# Altium footprint library PcbLib.PcbLib: 428 footprints (part 17 of 27)
Each footprint in its own frame and in the unit in brackets; x right, y up, seen from the top. Pads: shape width x height; smd on the part's side, far side on the other; paste and mask are expansions set on the pad; w line width, h text height; cw(c..) or ccw(c..) is an arc to the next point about the centre after c.
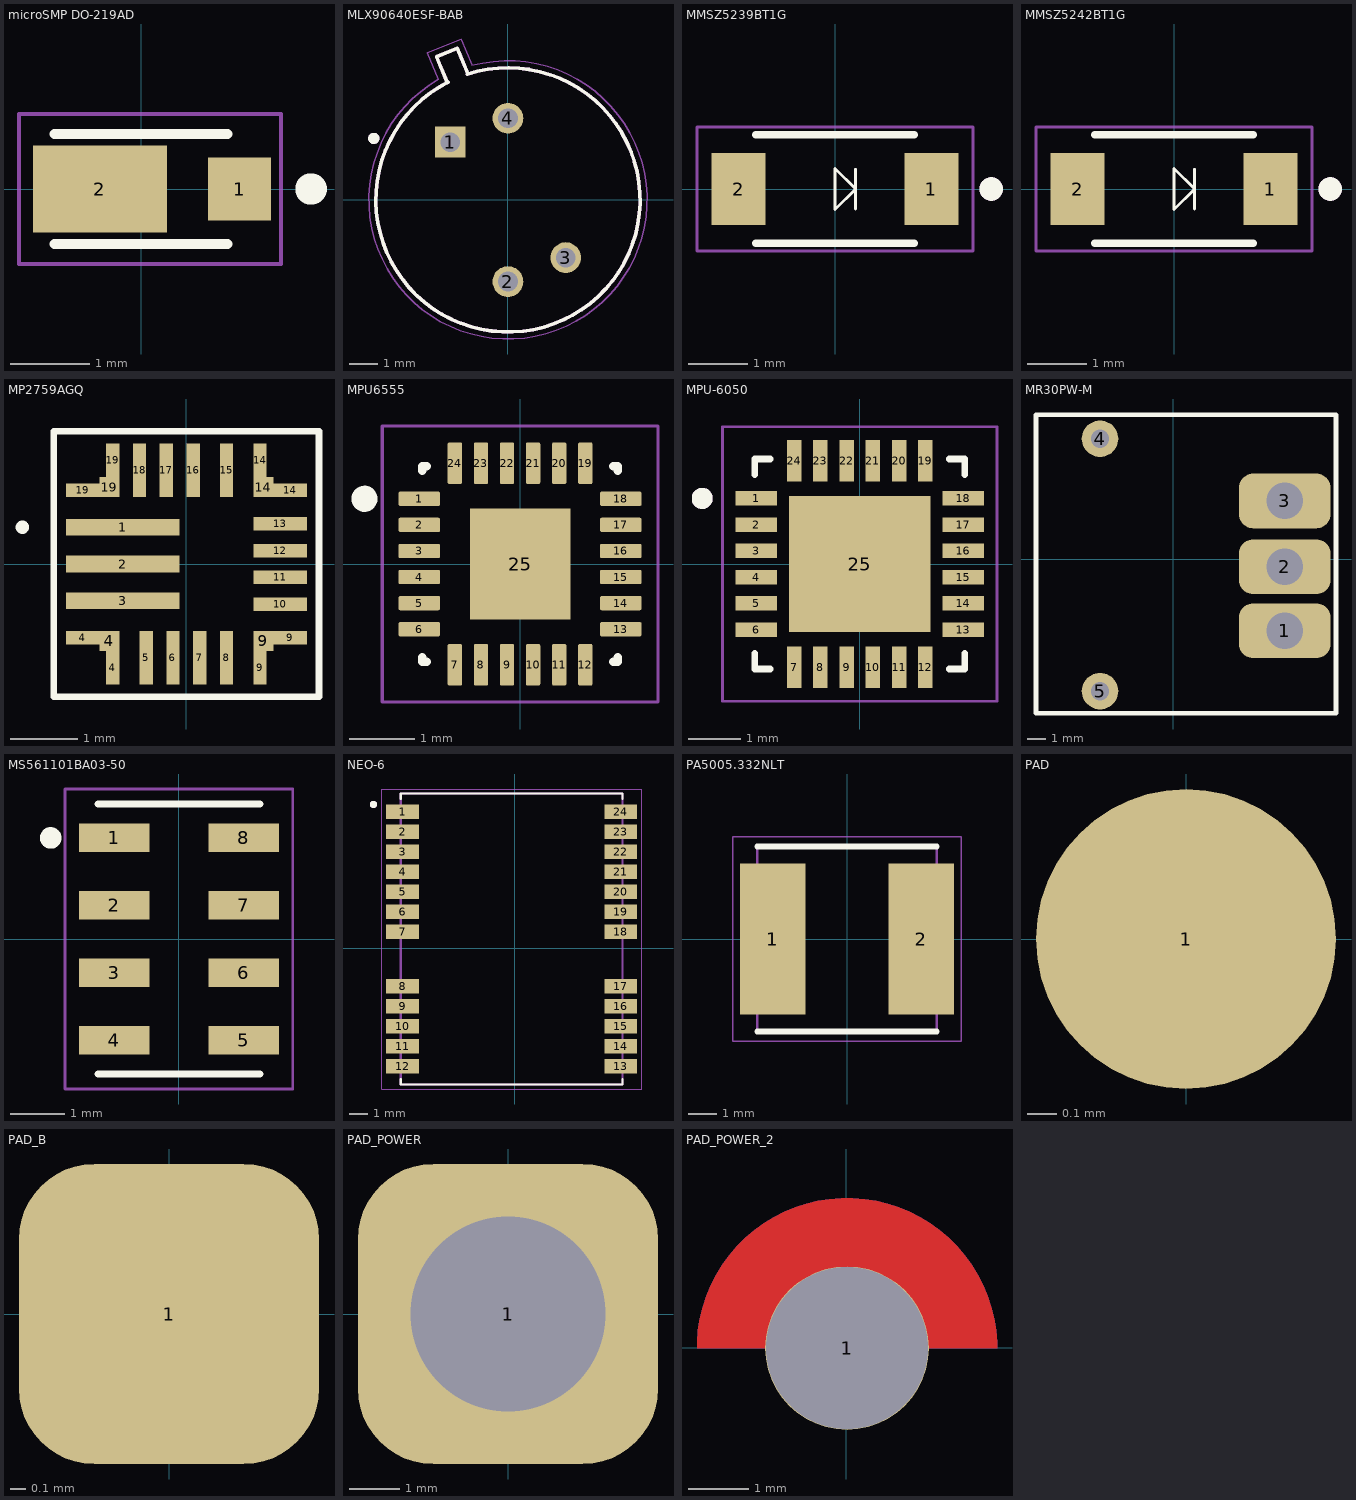
[diagram p16: the footprints below, top view; thin cyan lines are the x and y axes]

## microSMP DO-219AD [mm]
pads (2):
  rect 0.8x0.8 smd: 1(1.25,0)
  rect 1.7x1.1 smd: 2(-0.523,0)
Top Overlay:
  circle w0.2: c2.159,0 r0.1
  lines w0.127: -1.1,-0.7 1.1,-0.7 ; -1.1,0.7 1.1,0.7
Mechanical 15:
  lines w0.05: -1.549,-0.95 1.778,-0.95 1.778,0.95 -1.549,0.95 -1.549,-0.95
3D body "User Library-diode_microSMP.STEP": height 0.75, standoff 0, extent -0.971,-0.625 1.529,0.675

## MLX90640ESF-BAB [mm]
pads (4):
  rect 1.1x1.1 hole 0.7: 1(-2.065,2.067)
  round 1.1 hole 0.7: 2(0,-2.92) 3(2.065,-2.065) 4(0,2.92)
Top Overlay:
  circle w0.2: c-4.8,2.2 r0.1
  lines w0.127: -2.171,4.196 -2.554,5.12 -1.814,5.426 -1.432,4.503 ; -2.145,4.21 ccw(c0,0) -1.46,4.494
Mechanical 13:
  circle w0.2: c-4.8,2.2 r0.1
  lines w0.127: -2.171,4.196 -2.554,5.12 -1.814,5.426 -1.432,4.503 ; -2.145,4.21 ccw(c0,0) -1.46,4.494
Mechanical 15:
  lines w0.05: -2.488,4.308 -2.881,5.255 -1.679,5.753 -1.287,4.806 ; -2.487,4.309 ccw(c0,0) -1.287,4.806
3D body "MLX90640ESF-BAB-000-TU--3DModel-STEP-56544.STEP": height 11.55, standoff -6.5, extent -4.65,-4.65 4.65,5.151

## MMSZ5239BT1G [mm]
pads (2):
  rect 0.915x1.22 smd: 1(1.637,0) 2(-1.637,0)
Top Overlay:
  circle w0.2: c2.65,0 r0.1
  lines w0.05: 0,-0.35 0.35,0 0,0.35 ; 0,-0.338 0,0.337 ; 0.348,-0.339 0.348,0.336
  lines w0.127: -1.345,-0.924 1.345,-0.924 ; -1.345,0.924 1.345,0.924
Mechanical 13:
  circle w0.2: c2.65,0 r0.1
Mechanical 15:
  lines w0.05: -2.345,-1.05 2.345,-1.05 2.345,1.05 -2.345,1.05 -2.345,-1.05
3D body "step_temp.STEP": height 1.35, standoff 0, extent -1.84,-0.8 1.84,0.8

## MMSZ5242BT1G [mm]
pads (2):
  rect 0.915x1.22 smd: 1(1.637,0) 2(-1.637,0)
Top Overlay:
  circle w0.2: c2.65,0 r0.1
  lines w0.05: 0,-0.35 0.35,0 0,0.35 ; 0,-0.338 0,0.337 ; 0.348,-0.339 0.348,0.336
  lines w0.127: -1.345,-0.924 1.345,-0.924 ; -1.345,0.924 1.345,0.924
Mechanical 13:
  circle w0.2: c2.65,0 r0.1
Mechanical 15:
  lines w0.05: -2.345,-1.05 -2.345,1.05 2.345,1.05 2.345,-1.05 -2.345,-1.05
3D body "step_temp.STEP": height 1.35, standoff 0, extent -1.84,-0.8 1.84,0.8

## MP2759AGQ [mm]
pads (27):
  rect 1.7x0.25 smd: 1(-0.95,0.55) 2(-0.95,0) 3(-0.95,-0.55)
  rect 0.5x0.2 smd: 4(-1.55,-1.1) 9(1.55,-1.1) 14(1.55,1.1) 19(-1.55,1.1)
  rect 0.3x0.3 smd: 4(-1.15,-1.15) 9(1.15,-1.15) 14(1.15,1.15) 19(-1.15,1.15)
  rect 0.2x0.5 smd: 4(-1.1,-1.55) 9(1.1,-1.55) 14(1.1,1.55) 19(-1.1,1.55)
  rect 0.2x0.8 smd: 5(-0.6,-1.4) 6(-0.2,-1.4) 7(0.2,-1.4) 8(0.6,-1.4) 15(0.6,1.4) 16(0.1,1.4) 17(-0.3,1.4) 18(-0.7,1.4)
  rect 0.8x0.2 smd: 10(1.4,-0.6) 11(1.4,-0.2) 12(1.4,0.2) 13(1.4,0.6)
Top Overlay:
  lines w0.1: -2.5,0.55 ccw(c-2.45,0.55) -2.4,0.55 ccw(c-2.45,0.55) -2.5,0.55 ; -1.981,-1.981 -1.981,1.981 1.981,1.981 1.981,-1.981 -1.981,-1.981
3D body "MP2759GQ-0000-P.stp": height 1.1, standoff 0, extent -1.5,-1.5 1.5,1.5

## MPU6555 [mm]
pads (25):
  rrect25% 0.64x0.22 smd: 1(-1.545,1) 2(-1.545,0.6) 3(-1.545,0.2) 4(-1.545,-0.2) 5(-1.545,-0.6) 6(-1.545,-1) 13(1.545,-1) 14(1.545,-0.6) 15(1.545,-0.2) 16(1.545,0.2) 17(1.545,0.6) 18(1.545,1)
  rrect25% 0.22x0.64 smd: 7(-1,-1.545) 8(-0.6,-1.545) 9(-0.2,-1.545) 10(0.2,-1.545) 11(0.6,-1.545) 12(1,-1.545) 19(1,1.545) 20(0.6,1.545) 21(0.2,1.545) 22(-0.2,1.545) 23(-0.6,1.545) 24(-1,1.545)
  rect 1.54x1.7 smd paste-2: 25(0,0)
Top Overlay:
  circle w0.2: c-2.385,1 r0.1
  lines w0.127: -1.5,-1.43 -1.5,-1.5 -1.43,-1.5 ; -1.5,1.43 -1.5,1.5 -1.43,1.5 ; 1.43,-1.5 1.5,-1.5 1.5,-1.43 ; 1.43,1.5 1.5,1.5 1.5,1.43
Top Paste:
  region: 0.485,-0.54 -0.485,-0.54 -0.485,0.54 0.485,0.54
Mechanical 15:
  lines w0.05: -2.115,-2.115 -2.115,2.115 2.115,2.115 2.115,-2.115 -2.115,-2.115
3D body "MPU-6500--3DModel-STEP-1.STEP": height 0.95, standoff 0, extent -1.5,-1.5 1.5,1.5

## MPU-6050 [mm]
height 0.95
pads (25):
  rect 0.79x0.28 smd: 1(-1.97,1.25) 2(-1.97,0.75) 3(-1.97,0.25) 4(-1.97,-0.25) 5(-1.97,-0.75) 6(-1.97,-1.25) 13(1.97,-1.25) 14(1.97,-0.75) 15(1.97,-0.25) 16(1.97,0.25) 17(1.97,0.75) 18(1.97,1.25)
  rect 0.28x0.79 smd: 7(-1.25,-1.97) 8(-0.75,-1.97) 9(-0.25,-1.97) 10(0.25,-1.97) 11(0.75,-1.97) 12(1.25,-1.97) 19(1.25,1.97) 20(0.75,1.97) 21(0.25,1.97) 22(-0.25,1.97) 23(-0.75,1.97) 24(-1.25,1.97)
  rect 2.7x2.6 smd paste-0.5 mask-0.1: 25(0,0)
Top Overlay:
  circle w0.2: c-3,1.25 r0.1
  lines w0.127: -2,-1.705 -2,-2 -1.705,-2 ; -2,1.705 -2,2 -1.705,2 ; 1.705,-2 2,-2 2,-1.705 ; 1.705,2 2,2 2,1.705
Mechanical 13:
  circle w0.2: c-3,1.25 r0.1
Mechanical 15:
  lines w0.05: -2.615,-2.615 -2.615,2.615 2.615,2.615 2.615,-2.615 -2.615,-2.615
3D body "step_temp.STEP": height 0.93, standoff -0.02, extent -2,-2 2,2

## MR30PW-M [mm]
pads (5):
  rrect50% 5x3 hole 2: 1(6.1,-3.9) 2(6.1,-0.4) 3(6.1,3.2)
  round 2 hole 1: 4(-4,6.6) 5(-4,-7.2)
Top Overlay:
  lines w0.254: -7.5,-8.4 -7.5,7.9 8.9,7.9 8.9,-8.4 -7.5,-8.4
3D body "User Library-MR30PW-M.STEP": height 5.2, standoff -1.76, extent -7.39,-8.325 7.089,7.685

## MS561101BA03-50 [mm]
pads (8):
  rect 1.31x0.53 smd: 1(-1.2,1.875) 2(-1.2,0.625) 3(-1.2,-0.625) 4(-1.2,-1.875) 5(1.2,-1.875) 6(1.2,-0.625) 7(1.2,0.625) 8(1.2,1.875)
Top Overlay:
  circle w0.2: c-2.377,1.873 r0.1
  lines w0.127: -1.5,-2.5 1.5,-2.5 ; -1.5,2.5 1.5,2.5
Mechanical 15:
  lines w0.05: -2.11,-2.78 2.11,-2.78 2.11,2.78 -2.11,2.78 -2.11,-2.78
3D body "MS561101BA03-50--3DModel-STEP-1.STEP": height 1, standoff 0.05, extent -1.5,-2.48 1.5,2.52

## NEO-6 [mm]
pads (24):
  rect 1.8x0.8 smd paste-2: 1(-6.178,7.508) 2(-6.178,6.408) 3(-6.178,5.308) 4(-6.178,4.208) 5(-6.178,3.108) 6(-6.178,2.008) 7(-6.178,0.908) 8(-6.178,-2.092) 9(-6.178,-3.192) 10(-6.178,-4.292) 11(-6.178,-5.392) 12(-6.178,-6.492) 13(5.822,-6.492) 14(5.822,-5.392) 15(5.822,-4.292) 16(5.822,-3.192) 17(5.822,-2.092) 18(5.822,0.908) 19(5.822,2.008) 20(5.822,3.108) 21(5.822,4.208) 22(5.822,5.308) 23(5.822,6.408) 24(5.822,7.508)
Top Overlay:
  circle w0.2: c-7.778,7.908 r0.1
  lines w0.127: -6.278,-7.212 -6.278,-7.492 5.922,-7.492 5.922,-7.212 ; -6.278,8.228 -6.278,8.508 5.922,8.508 5.922,8.228
Top Paste:
  drawing of 24 lines, arcs and shapes, not listed
Mechanical 13:
  circle w0.2: c-7.778,7.908 r0.1
  lines w0.127: -6.278,-7.492 5.922,-7.492 5.922,8.508 -6.278,8.508 -6.278,-7.492
Mechanical 15:
  lines w0.05: -7.328,-7.742 6.972,-7.742 6.972,8.758 -7.328,8.758 -7.328,-7.742
3D body "step_temp.STEP": height 2.6, standoff 0, extent -6.278,-7.492 5.922,8.508

## PA5005.332NLT [mm]
pads (2):
  rect 2.35x5.4 smd: 1(-2.65,0) 2(2.65,0)
Top Overlay:
  lines w0.2: -3.2,-3.3 3.2,-3.3 ; -3.2,3.3 3.2,3.3
Mechanical 15:
  lines w0.1: -3.2,-3.3 3.2,-3.3 3.2,3.3 -3.2,3.3 -3.2,-3.3
Mechanical 20:
  lines w0.05: -4.075,-3.65 4.075,-3.65 4.075,3.65 -4.075,3.65 -4.075,-3.65
3D body "PA5005.332NLT.stp": height 5, standoff 0, extent -3.225,-3.3 3.175,3.3

## PAD [mil] "TestPoint"
height 3.94
pads (1):
  round 40 smd: 1(0,0)
3D body: height 1.18, standoff 0, extent -20,-19.68 19.37,19.68

## PAD_B [mm] "TestPoint"
height 0.1
pads (1):
  rrect50% 2x2 smd: 1(0,0)
3D body: height 0.05, standoff 0.01, extent -1,-1.001 1,1

## PAD_POWER [mm] "TestPoint"
height 0.1
pads (1):
  rrect50% 6x6 hole 3.9: 1(0,0)

## PAD_POWER_2 [mm] "TestPoint"
height 0.1
pads (1):
  round 2.725 hole 2.7: 1(0.01,-0.01)
Top Layer:
  region: -2.49,-0.01 -2.49,0.088 -2.475,0.284 -2.444,0.478 -2.398,0.669 -2.337,0.856 -2.262,1.037 -2.173,1.212 -2.07,1.38 -1.955,1.539 -1.827,1.688 -1.688,1.827 -1.539,1.955 -1.38,2.07 -1.212,2.173 -1.037,2.262 -0.856,2.337 -0.669,2.398 -0.478,2.444 -0.284,2.475 -0.088,2.49 0.01,2.49 0.108,2.49 0.304,2.475 0.498,2.444 0.689,2.398 0.876,2.337 1.057,2.262 1.232,2.173 1.4,2.07 1.559,1.955 1.708,1.827 1.847,1.688 1.975,1.539 2.09,1.38 2.193,1.212 2.282,1.037 2.357,0.856 2.418,0.669 2.464,0.478 2.495,0.284 2.51,0.088 2.51,-0.01
Bottom Layer:
  region: -2.49,-0.01 -2.49,0.088 -2.475,0.284 -2.444,0.478 -2.398,0.669 -2.337,0.856 -2.262,1.037 -2.173,1.212 -2.07,1.38 -1.955,1.539 -1.827,1.688 -1.688,1.827 -1.539,1.955 -1.38,2.07 -1.212,2.173 -1.037,2.262 -0.856,2.337 -0.669,2.398 -0.478,2.444 -0.284,2.475 -0.088,2.49 0.01,2.49 0.108,2.49 0.304,2.475 0.498,2.444 0.689,2.398 0.876,2.337 1.057,2.262 1.232,2.173 1.4,2.07 1.559,1.955 1.708,1.827 1.847,1.688 1.975,1.539 2.09,1.38 2.193,1.212 2.282,1.037 2.357,0.856 2.418,0.669 2.464,0.478 2.495,0.284 2.51,0.088 2.51,-0.01

## PCBComponent_1 [mm]